# Altium footprint library General.PCBLIB: 226 footprints (part 6 of 15)
Each footprint in its own frame and in the unit in brackets; x right, y up, seen from the top. Pads: shape width x height; smd on the part's side, far side on the other; paste and mask are expansions set on the pad; w line width, h text height; cw(c..) or ccw(c..) is an arc to the next point about the centre after c.
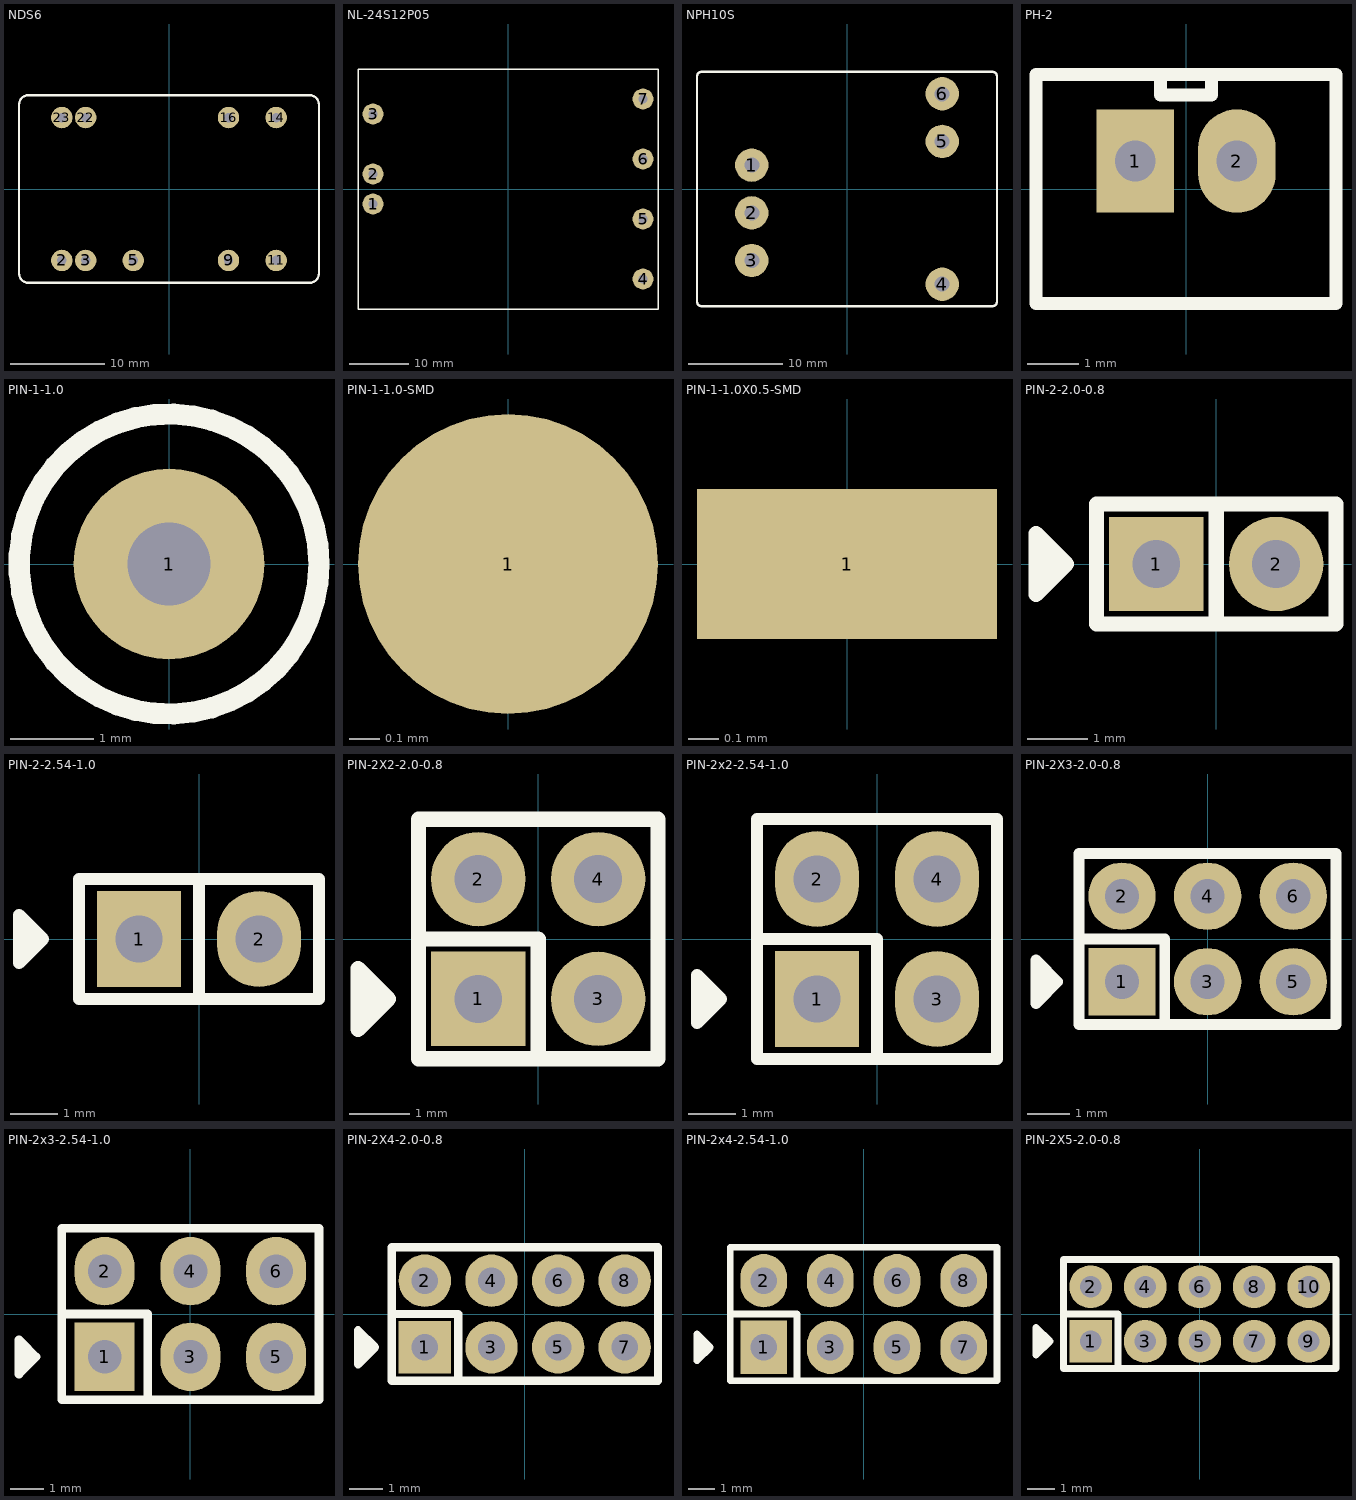
[diagram p5: the footprints below, top view; thin cyan lines are the x and y axes]

## NDS6 [mil] "MURATA POWER"
height 393.7
pads (9):
  round 90 hole 39.37: 2(-450,-300) 3(-350,-300) 5(-150,-300) 9(250,-300) 11(450,-300) 14(450,300) 16(250,300) 22(-350,300) 23(-450,300)
Top Overlay:
  lines w10: -629.92,-354.33 ccw(c-590.55,-354.33) -590.55,-393.7 590.55,-393.7 ccw(c590.55,-354.33) 629.92,-354.33 629.92,354.33 ccw(c590.55,354.33) 590.55,393.7 -590.55,393.7 ccw(c-590.55,354.33) -629.92,354.33 -629.92,-354.33
3D body: height 393.7, standoff 0, extent -629.92,-393.7 629.92,393.7

## NL-24S12P05 [mil] "NINGLU POWER"
height 275.59
pads (7):
  round 140 hole 59.06: 1(-900,-100) 2(-900,100) 3(-900,500) 4(900,-600) 5(900,-200) 6(900,200) 7(900,600)
Top Overlay:
  lines w10: -1000,-800 -1000,800 1000,800 1000,-800 -1000,-800
3D body: height 275.59, standoff 0, extent -1000,-800 1000,800

## NPH10S [mil] "MURATA POWER"
height 393.7
pads (6):
  round 140 hole 62.99: 1(-400,100) 2(-400,-100) 3(-400,-300) 4(400,-400) 5(400,200) 6(400,400)
Top Overlay:
  lines w10: -629.92,-472.13 ccw(c-609.92,-472.13) -609.92,-492.13 609.92,-492.13 ccw(c609.92,-472.13) 629.92,-472.13 629.92,472.13 ccw(c609.92,472.13) 609.92,492.13 -609.92,492.13 ccw(c-609.92,472.13) -629.92,472.13 -629.92,-472.13
3D body: height 393.7, standoff 0, extent -629.92,-492.13 629.92,492.13

## PH-2 [mm] "Pin Header"
height 6
pads (2):
  rect 1.524x2.032 hole 0.8: 1(-1,0.55)
  oval 1.524x2.032 hole 0.8: 2(1,0.55)
Top Overlay:
  lines w0.254: -0.5,2.25 -0.5,1.85 0.5,1.85 0.5,2.25 ; -2.95,-2.25 -2.95,2.25 2.95,2.25 2.95,-2.25 -2.95,-2.25
3D body: height 6, standoff -1.91, extent -2.95,-2.25 3.05,2.25

## PIN-1-1.0 [mil] "Pin Header"
height 374.02
pads (1):
  round 90 hole 39.37: 1(0,0)
Top Overlay:
  circle w10: c0,0 r70.87
3D body: height 397.64, standoff -59.06, extent -50,-50 50,50

## PIN-1-1.0-SMD [mm] "Test Point"
pads (1):
  round 1 smd: 1(0,0)

## PIN-1-1.0X0.5-SMD [mm] "Test Point"
pads (1):
  rect 1x0.5 smd: 1(0,0)

## PIN-2-2.0-0.8 [mm] "Pin Header"
height 3.8
pads (2):
  rect 1.575x1.575 hole 0.8: 1(-1,0)
  round 1.575 hole 0.8: 2(1,0)
Top Overlay:
  lines w0.254: -2.754,-0.254 -2.754,0.254 ; 0,-1 0,1 ; -3.008,-0.508 -2.5,0 -3.008,0.508 -3.008,-0.508 ; -2,-1 -2,1 2,1 2,-1 -2,-1
3D body: height 5.31, standoff -1.17, extent -2,-1 1.998,0.999

## PIN-2-2.54-1.0 [mil] "Pin Header"
height 374.02
pads (2):
  rect 70x80 hole 39.37: 1(-50,0)
  oval 70x80 hole 39.37: 2(50,0)
Top Overlay:
  lines w10: -140,-10 -140,10 ; 0,-50 0,50 ; -150,-20 -130,0 -150,20 -150,-20 ; -100,-50 100,-50 100,50 -100,50 -100,-50
3D body: height 397.64, standoff -59.06, extent -100,-50 100,50

## PIN-2X2-2.0-0.8 [mm] "Pin Header"
height 3.8
pads (4):
  rect 1.575x1.575 hole 0.8: 1(-1,-1)
  round 1.575 hole 0.8: 2(-1,1) 3(1,-1) 4(1,1)
Top Overlay:
  lines w0.254: -2.754,-1.254 -2.754,-0.746 ; -2,0 0,0 0,-2 ; -3.008,-1.508 -2.5,-1 -3.008,-0.492 -3.008,-1.508 ; -2,-2 -2,2 2,2 2,-2 -2,-2
3D body: height 5.31, standoff -1.17, extent -2,-2 1.998,1.998

## PIN-2x2-2.54-1.0 [mil] "Pin Header"
height 374.02
pads (4):
  rect 70x80 hole 39.37: 1(-50,-50)
  oval 70x80 hole 39.37: 2(-50,50) 3(50,-50) 4(50,50)
Top Overlay:
  lines w10: -140,-60 -140,-40 ; -100,0 0,0 0,-100 ; -150,-70 -150,-30 -130,-50 -150,-70 ; -100,-100 100,-100 100,100 -100,100 -100,-100
3D body: height 397.64, standoff -59.06, extent -100,-100 100,100

## PIN-2X3-2.0-0.8 [mm] "Pin Header"
height 3.8
pads (6):
  rect 1.575x1.575 hole 0.8: 1(-2,-1)
  round 1.575 hole 0.8: 2(-2,1) 3(0,-1) 4(0,1) 5(2,-1) 6(2,1)
Top Overlay:
  lines w0.254: -3.754,-1.254 -3.754,-0.746 ; -3,0 -1,0 -1,-2 ; -4.008,-1.508 -4.008,-0.492 -3.5,-1 -4.008,-1.508 ; -3,-2 3,-2 3,2 -3,2 -3,-2
3D body: height 5.31, standoff -1.17, extent -3,-2 2.997,1.998

## PIN-2x3-2.54-1.0 [mil] "Pin Header"
height 374.02
pads (6):
  rect 70x80 hole 39.37: 1(-100,-50)
  oval 70x80 hole 39.37: 2(-100,50) 3(0,-50) 4(0,50) 5(100,-50) 6(100,50)
Top Overlay:
  lines w10: -190,-60 -190,-40 ; -150,0 -50,0 -50,-100 ; -200,-70 -180,-50 -200,-30 -200,-70 ; -150,-100 -150,100 150,100 150,-100 -150,-100
3D body: height 397.64, standoff -59.06, extent -150,-100 150,100

## PIN-2X4-2.0-0.8 [mm] "Pin Header"
height 3.8
pads (8):
  rect 1.575x1.575 hole 0.8: 1(-3,-1)
  round 1.575 hole 0.8: 2(-3,1) 3(-1,-1) 4(-1,1) 5(1,-1) 6(1,1) 7(3,-1) 8(3,1)
Top Overlay:
  lines w0.254: -4.754,-1.254 -4.754,-0.746 ; -4,0 -2,0 -2,-2 ; -5.008,-1.508 -4.5,-1 -5.008,-0.492 -5.008,-1.508 ; -4,-2 -4,2 4,2 4,-2 -4,-2
3D body: height 5.31, standoff -1.17, extent -4,-2 3.996,1.998

## PIN-2x4-2.54-1.0 [mil] "Pin Header"
height 374.02
pads (8):
  rect 70x80 hole 39.37: 1(-150,-50)
  oval 70x80 hole 39.37: 2(-150,50) 3(-50,-50) 4(-50,50) 5(50,-50) 6(50,50) 7(150,-50) 8(150,50)
Top Overlay:
  lines w10: -240,-60 -240,-40 ; -200,0 -100,0 -100,-100 ; -250,-70 -250,-30 -230,-50 -250,-70 ; -200,-100 200,-100 200,100 -200,100 -200,-100
3D body: height 397.64, standoff -59.06, extent -200,-100 200,100

## PIN-2X5-2.0-0.8 [mm] "Pin Header"
height 3.8
pads (10):
  rect 1.575x1.575 hole 0.8: 1(-4,-1)
  round 1.575 hole 0.8: 2(-4,1) 3(-2,-1) 4(-2,1) 5(0,-1) 6(0,1) 7(2,-1) 8(2,1) 9(4,-1) 10(4,1)
Top Overlay:
  lines w0.254: -5.754,-1.254 -5.754,-0.746 ; -5,0 -3,0 -3,-2 ; -6.008,-1.508 -6.008,-0.492 -5.5,-1 -6.008,-1.508 ; -5,-2 5,-2 5,2 -5,2 -5,-2
3D body: height 5.31, standoff -1.17, extent -5,-2 4.995,1.998